# Altium integrated library Weidmueller_OMNIMATE_Signal.IntLib: 2550 symbols (part 36 of 45)
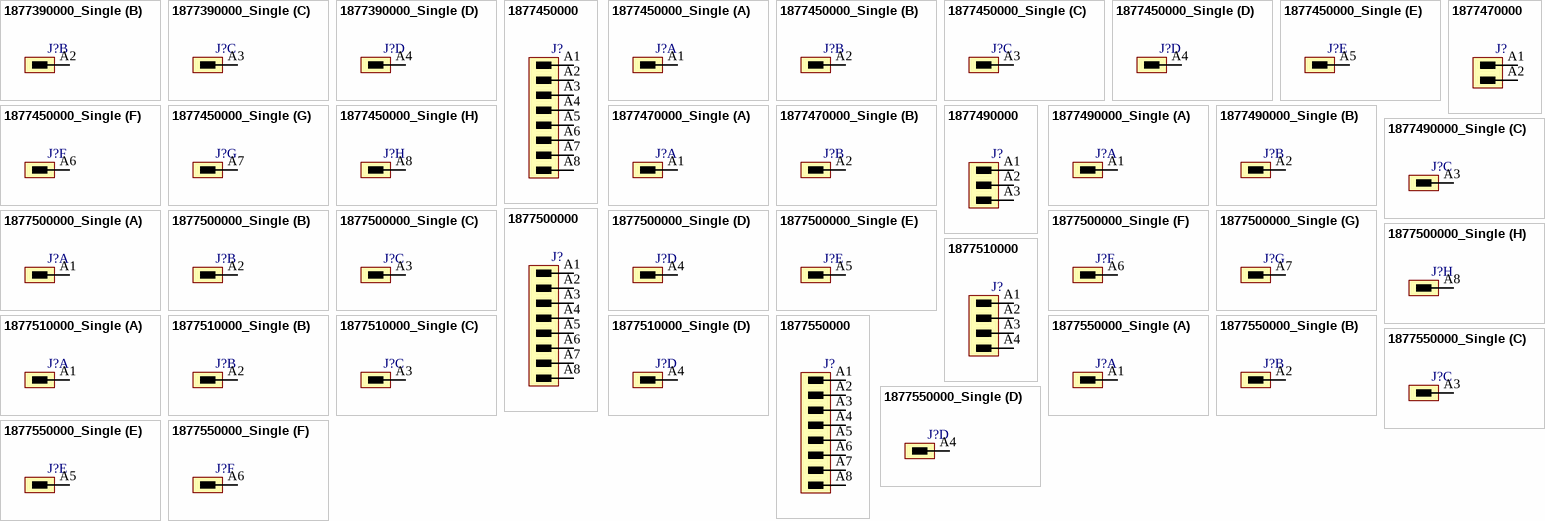
[diagram p246: symbols 1877390000_Single to 1877550000_Single]

## 1877510000_Single
designator J?
OMNIMATE Signal - series BL/SL 5.08; PartNumber: 1877510000; Manufacturer: Weidmueller; Short_text_for_material: SL-SMT 5.08/04/270GL 3.2SN BK BX; Side_termination_characteristic: closed side; Mounting_onto_the_PCB: Reflow solder connection; Pitch_mm: 5.08 mm; Pitch_inch: 0.2 inch; No_of_poles: 4; Outgoing_elbow: 270°; Solder_pin_length_mm: 3.2 mm; Contact_material: CuSn; Contact_surface: tinned; Insulating_material: LCP GF; UL_94_flammability_rating: V-0; Rated_voltage_for_surge_voltage_class_pollution_degree_II_2: 400 V; Rated_current_min_no_of_poles_TU_20_deg_C: 19 A; Rated_voltage_use_group_B_UL_1059: 300 V; Rated_current_use_group_B_UL_1059: 15 A; PackageReference: SL_SMT_5_08_270GL_04; Colour: Black; Packaging: Box; Qty: 100 PCS; Revision: V1; ComponentLink1Description: Manufacturer URL; ComponentLink1URL: http://www.weidmueller.com/; ComponentLink2Description: URL Link1; ComponentLink2URL: http://catalog.weidmueller.com/catalog/Start.do?localeId=en&ObjectID=1877510000
footprint SL_SMT_5_08_270GL_04 (OMNIMATE Signal - Serie BL/SL 5.08  SL-SMT 5.08/04/270GL 3.2)
part A pins: A1
part B pins: A2
part C pins: A3
part D pins: A4

## 1877550000
designator J?
OMNIMATE Signal - series BL/SL 5.08; PartNumber: 1877550000; Manufacturer: Weidmueller; Short_text_for_material: SL-SMT 5.08/08/270GL 3.2SN BK BX; Side_termination_characteristic: closed side; Mounting_onto_the_PCB: Reflow solder connection; Pitch_mm: 5.08 mm; Pitch_inch: 0.2 inch; No_of_poles: 8; Outgoing_elbow: 270°; Solder_pin_length_mm: 3.2 mm; Contact_material: CuSn; Contact_surface: tinned; Insulating_material: LCP GF; UL_94_flammability_rating: V-0; Rated_voltage_for_surge_voltage_class_pollution_degree_II_2: 400 V; Rated_current_min_no_of_poles_TU_20_deg_C: 19 A; Rated_voltage_use_group_B_UL_1059: 300 V; Rated_current_use_group_B_UL_1059: 15 A; PackageReference: SL_SMT_5_08_270GL_08; Colour: Black; Packaging: Box; Qty: 50 PCS; Revision: V1; ComponentLink1Description: Manufacturer URL; ComponentLink1URL: http://www.weidmueller.com/; ComponentLink2Description: URL Link1; ComponentLink2URL: http://catalog.weidmueller.com/catalog/Start.do?localeId=en&ObjectID=1877550000
footprint SL_SMT_5_08_270GL_08 (OMNIMATE Signal - Serie BL/SL 5.08  SL-SMT 5.08/08/270GL 3.2)
pins: A1, A2, A3, A4, A5, A6, A7, A8

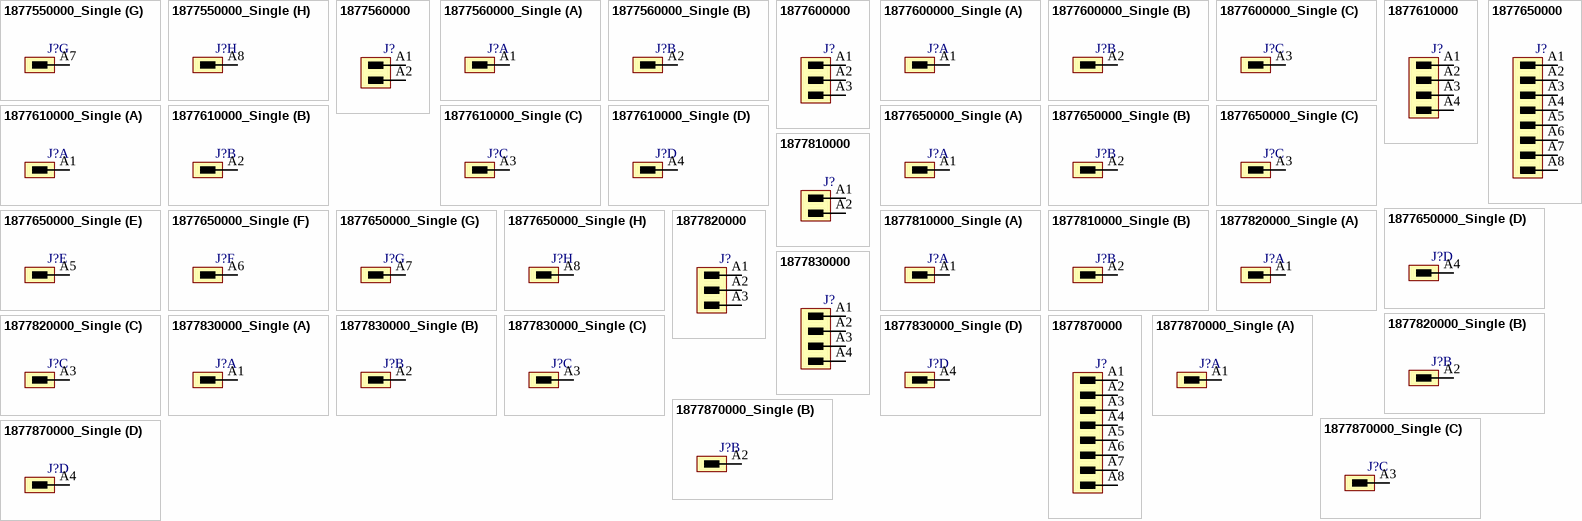
[diagram p169: symbols 1877550000_Single to 1877870000_Single]

## 1877550000_Single
designator J?
OMNIMATE Signal - series BL/SL 5.08; PartNumber: 1877550000; Manufacturer: Weidmueller; Short_text_for_material: SL-SMT 5.08/08/270GL 3.2SN BK BX; Side_termination_characteristic: closed side; Mounting_onto_the_PCB: Reflow solder connection; Pitch_mm: 5.08 mm; Pitch_inch: 0.2 inch; No_of_poles: 8; Outgoing_elbow: 270°; Solder_pin_length_mm: 3.2 mm; Contact_material: CuSn; Contact_surface: tinned; Insulating_material: LCP GF; UL_94_flammability_rating: V-0; Rated_voltage_for_surge_voltage_class_pollution_degree_II_2: 400 V; Rated_current_min_no_of_poles_TU_20_deg_C: 19 A; Rated_voltage_use_group_B_UL_1059: 300 V; Rated_current_use_group_B_UL_1059: 15 A; PackageReference: SL_SMT_5_08_270GL_08; Colour: Black; Packaging: Box; Qty: 50 PCS; Revision: V1; ComponentLink1Description: Manufacturer URL; ComponentLink1URL: http://www.weidmueller.com/; ComponentLink2Description: URL Link1; ComponentLink2URL: http://catalog.weidmueller.com/catalog/Start.do?localeId=en&ObjectID=1877550000
footprint SL_SMT_5_08_270GL_08 (OMNIMATE Signal - Serie BL/SL 5.08  SL-SMT 5.08/08/270GL 3.2)
part A pins: A1
part B pins: A2
part C pins: A3
part D pins: A4
part E pins: A5
part F pins: A6
part G pins: A7
part H pins: A8

## 1877560000
designator J?
OMNIMATE Signal - series BL/SL 5.08; PartNumber: 1877560000; Manufacturer: Weidmueller; Short_text_for_material: SL-SMT 5.08/02/270GH 1.5SN BK RL; Side_termination_characteristic: closed side; Mounting_onto_the_PCB: Reflow solder connection; Pitch_mm: 5.08 mm; Pitch_inch: 0.2 inch; No_of_poles: 2; Outgoing_elbow: 270°; Solder_pin_length_mm: 1.5 mm; Contact_surface: tinned; Insulating_material: LCP GF; UL_94_flammability_rating: V-0; Rated_voltage_for_surge_voltage_class_pollution_degree_II_2: 400 V; Rated_current_min_no_of_poles_TU_20_deg_C: 19 A; Rated_voltage_use_group_B_UL_1059: 300 V; Rated_current_use_group_B_UL_1059: 15 A; PackageReference: SL_SMT_5_08_270GH_02; Colour: Black; Packaging: Tape; Qty: 335 PCS; Revision: V1; ComponentLink1Description: Manufacturer URL; ComponentLink1URL: http://www.weidmueller.com/; ComponentLink2Description: URL Link1; ComponentLink2URL: http://catalog.weidmueller.com/catalog/Start.do?localeId=en&ObjectID=1877560000
footprint SL_SMT_5_08_270GH_02 (OMNIMATE Signal - Serie BL/SL 5.08  SL-SMT 5.08/02/270GH 3.2)
pins: A1, A2

## 1877560000_Single
designator J?
OMNIMATE Signal - series BL/SL 5.08; PartNumber: 1877560000; Manufacturer: Weidmueller; Short_text_for_material: SL-SMT 5.08/02/270GH 1.5SN BK RL; Side_termination_characteristic: closed side; Mounting_onto_the_PCB: Reflow solder connection; Pitch_mm: 5.08 mm; Pitch_inch: 0.2 inch; No_of_poles: 2; Outgoing_elbow: 270°; Solder_pin_length_mm: 1.5 mm; Contact_surface: tinned; Insulating_material: LCP GF; UL_94_flammability_rating: V-0; Rated_voltage_for_surge_voltage_class_pollution_degree_II_2: 400 V; Rated_current_min_no_of_poles_TU_20_deg_C: 19 A; Rated_voltage_use_group_B_UL_1059: 300 V; Rated_current_use_group_B_UL_1059: 15 A; PackageReference: SL_SMT_5_08_270GH_02; Colour: Black; Packaging: Tape; Qty: 335 PCS; Revision: V1; ComponentLink1Description: Manufacturer URL; ComponentLink1URL: http://www.weidmueller.com/; ComponentLink2Description: URL Link1; ComponentLink2URL: http://catalog.weidmueller.com/catalog/Start.do?localeId=en&ObjectID=1877560000
footprint SL_SMT_5_08_270GH_02 (OMNIMATE Signal - Serie BL/SL 5.08  SL-SMT 5.08/02/270GH 3.2)
part A pins: A1
part B pins: A2

## 1877600000
designator J?
OMNIMATE Signal - series BL/SL 5.08; PartNumber: 1877600000; Manufacturer: Weidmueller; Short_text_for_material: SL-SMT 5.08/03/270GH 1.5SN BK RL; Side_termination_characteristic: closed side; Mounting_onto_the_PCB: Reflow solder connection; Pitch_mm: 5.08 mm; Pitch_inch: 0.2 inch; No_of_poles: 3; Outgoing_elbow: 270°; Solder_pin_length_mm: 1.5 mm; Contact_surface: tinned; Insulating_material: LCP GF; UL_94_flammability_rating: V-0; Rated_voltage_for_surge_voltage_class_pollution_degree_II_2: 400 V; Rated_current_min_no_of_poles_TU_20_deg_C: 19 A; Rated_voltage_use_group_B_UL_1059: 300 V; Rated_current_use_group_B_UL_1059: 15 A; PackageReference: SL_SMT_5_08_270GH_03; Colour: Black; Packaging: Tape; Qty: 335 PCS; Revision: V1; ComponentLink1Description: Manufacturer URL; ComponentLink1URL: http://www.weidmueller.com/; ComponentLink2Description: URL Link1; ComponentLink2URL: http://catalog.weidmueller.com/catalog/Start.do?localeId=en&ObjectID=1877600000
footprint SL_SMT_5_08_270GH_03 (OMNIMATE Signal - Serie BL/SL 5.08  SL-SMT 5.08/03/270GH 3.2)
pins: A1, A2, A3

## 1877600000_Single
designator J?
OMNIMATE Signal - series BL/SL 5.08; PartNumber: 1877600000; Manufacturer: Weidmueller; Short_text_for_material: SL-SMT 5.08/03/270GH 1.5SN BK RL; Side_termination_characteristic: closed side; Mounting_onto_the_PCB: Reflow solder connection; Pitch_mm: 5.08 mm; Pitch_inch: 0.2 inch; No_of_poles: 3; Outgoing_elbow: 270°; Solder_pin_length_mm: 1.5 mm; Contact_surface: tinned; Insulating_material: LCP GF; UL_94_flammability_rating: V-0; Rated_voltage_for_surge_voltage_class_pollution_degree_II_2: 400 V; Rated_current_min_no_of_poles_TU_20_deg_C: 19 A; Rated_voltage_use_group_B_UL_1059: 300 V; Rated_current_use_group_B_UL_1059: 15 A; PackageReference: SL_SMT_5_08_270GH_03; Colour: Black; Packaging: Tape; Qty: 335 PCS; Revision: V1; ComponentLink1Description: Manufacturer URL; ComponentLink1URL: http://www.weidmueller.com/; ComponentLink2Description: URL Link1; ComponentLink2URL: http://catalog.weidmueller.com/catalog/Start.do?localeId=en&ObjectID=1877600000
footprint SL_SMT_5_08_270GH_03 (OMNIMATE Signal - Serie BL/SL 5.08  SL-SMT 5.08/03/270GH 3.2)
part A pins: A1
part B pins: A2
part C pins: A3

## 1877610000
designator J?
OMNIMATE Signal - series BL/SL 5.08; PartNumber: 1877610000; Manufacturer: Weidmueller; Short_text_for_material: SL-SMT 5.08/04/270GH 1.5SN BK RL; Side_termination_characteristic: closed side; Mounting_onto_the_PCB: Reflow solder connection; Pitch_mm: 5.08 mm; Pitch_inch: 0.2 inch; No_of_poles: 4; Outgoing_elbow: 270°; Solder_pin_length_mm: 1.5 mm; Contact_surface: tinned; Insulating_material: LCP GF; UL_94_flammability_rating: V-0; Rated_voltage_for_surge_voltage_class_pollution_degree_II_2: 400 V; Rated_current_min_no_of_poles_TU_20_deg_C: 19 A; Rated_voltage_use_group_B_UL_1059: 300 V; Rated_current_use_group_B_UL_1059: 15 A; PackageReference: SL_SMT_5_08_270GH_04; Colour: Black; Packaging: Tape; Qty: 335 PCS; Revision: V1; ComponentLink1Description: Manufacturer URL; ComponentLink1URL: http://www.weidmueller.com/; ComponentLink2Description: URL Link1; ComponentLink2URL: http://catalog.weidmueller.com/catalog/Start.do?localeId=en&ObjectID=1877610000
footprint SL_SMT_5_08_270GH_04 (OMNIMATE Signal - Serie BL/SL 5.08  SL-SMT 5.08/04/270GH 3.2)
pins: A1, A2, A3, A4

## 1877610000_Single
designator J?
OMNIMATE Signal - series BL/SL 5.08; PartNumber: 1877610000; Manufacturer: Weidmueller; Short_text_for_material: SL-SMT 5.08/04/270GH 1.5SN BK RL; Side_termination_characteristic: closed side; Mounting_onto_the_PCB: Reflow solder connection; Pitch_mm: 5.08 mm; Pitch_inch: 0.2 inch; No_of_poles: 4; Outgoing_elbow: 270°; Solder_pin_length_mm: 1.5 mm; Contact_surface: tinned; Insulating_material: LCP GF; UL_94_flammability_rating: V-0; Rated_voltage_for_surge_voltage_class_pollution_degree_II_2: 400 V; Rated_current_min_no_of_poles_TU_20_deg_C: 19 A; Rated_voltage_use_group_B_UL_1059: 300 V; Rated_current_use_group_B_UL_1059: 15 A; PackageReference: SL_SMT_5_08_270GH_04; Colour: Black; Packaging: Tape; Qty: 335 PCS; Revision: V1; ComponentLink1Description: Manufacturer URL; ComponentLink1URL: http://www.weidmueller.com/; ComponentLink2Description: URL Link1; ComponentLink2URL: http://catalog.weidmueller.com/catalog/Start.do?localeId=en&ObjectID=1877610000
footprint SL_SMT_5_08_270GH_04 (OMNIMATE Signal - Serie BL/SL 5.08  SL-SMT 5.08/04/270GH 3.2)
part A pins: A1
part B pins: A2
part C pins: A3
part D pins: A4

## 1877650000
designator J?
OMNIMATE Signal - series BL/SL 5.08; PartNumber: 1877650000; Manufacturer: Weidmueller; Short_text_for_material: SL-SMT 5.08/08/270GH 1.5SN BK RL; Side_termination_characteristic: closed side; Mounting_onto_the_PCB: Reflow solder connection; Pitch_mm: 5.08 mm; Pitch_inch: 0.2 inch; No_of_poles: 8; Outgoing_elbow: 270°; Solder_pin_length_mm: 1.5 mm; Contact_surface: tinned; Insulating_material: LCP GF; UL_94_flammability_rating: V-0; Rated_voltage_for_surge_voltage_class_pollution_degree_II_2: 400 V; Rated_current_min_no_of_poles_TU_20_deg_C: 19 A; Rated_voltage_use_group_B_UL_1059: 300 V; Rated_current_use_group_B_UL_1059: 15 A; PackageReference: SL_SMT_5_08_270GH_08; Colour: Black; Packaging: Tape; Qty: 285 PCS; Revision: V1; ComponentLink1Description: Manufacturer URL; ComponentLink1URL: http://www.weidmueller.com/; ComponentLink2Description: URL Link1; ComponentLink2URL: http://catalog.weidmueller.com/catalog/Start.do?localeId=en&ObjectID=1877650000
footprint SL_SMT_5_08_270GH_08 (OMNIMATE Signal - Serie BL/SL 5.08  SL-SMT 5.08/08/270GH 3.2)
pins: A1, A2, A3, A4, A5, A6, A7, A8

## 1877650000_Single
designator J?
OMNIMATE Signal - series BL/SL 5.08; PartNumber: 1877650000; Manufacturer: Weidmueller; Short_text_for_material: SL-SMT 5.08/08/270GH 1.5SN BK RL; Side_termination_characteristic: closed side; Mounting_onto_the_PCB: Reflow solder connection; Pitch_mm: 5.08 mm; Pitch_inch: 0.2 inch; No_of_poles: 8; Outgoing_elbow: 270°; Solder_pin_length_mm: 1.5 mm; Contact_surface: tinned; Insulating_material: LCP GF; UL_94_flammability_rating: V-0; Rated_voltage_for_surge_voltage_class_pollution_degree_II_2: 400 V; Rated_current_min_no_of_poles_TU_20_deg_C: 19 A; Rated_voltage_use_group_B_UL_1059: 300 V; Rated_current_use_group_B_UL_1059: 15 A; PackageReference: SL_SMT_5_08_270GH_08; Colour: Black; Packaging: Tape; Qty: 285 PCS; Revision: V1; ComponentLink1Description: Manufacturer URL; ComponentLink1URL: http://www.weidmueller.com/; ComponentLink2Description: URL Link1; ComponentLink2URL: http://catalog.weidmueller.com/catalog/Start.do?localeId=en&ObjectID=1877650000
footprint SL_SMT_5_08_270GH_08 (OMNIMATE Signal - Serie BL/SL 5.08  SL-SMT 5.08/08/270GH 3.2)
part A pins: A1
part B pins: A2
part C pins: A3
part D pins: A4
part E pins: A5
part F pins: A6
part G pins: A7
part H pins: A8

## 1877810000
designator J?
OMNIMATE Signal - series BL/SL 5.08; PartNumber: 1877810000; Manufacturer: Weidmueller; Short_text_for_material: SL-SMT 5.08/02/270GH 3.2SN BK RL; Side_termination_characteristic: closed side; Mounting_onto_the_PCB: Reflow solder connection; Pitch_mm: 5.08 mm; Pitch_inch: 0.2 inch; No_of_poles: 2; Outgoing_elbow: 270°; Solder_pin_length_mm: 3.2 mm; Contact_surface: tinned; Insulating_material: LCP GF; UL_94_flammability_rating: V-0; Rated_voltage_for_surge_voltage_class_pollution_degree_II_2: 400 V; Rated_current_min_no_of_poles_TU_20_deg_C: 19 A; Rated_voltage_use_group_B_UL_1059: 300 V; Rated_current_use_group_B_UL_1059: 15 A; PackageReference: SL_SMT_5_08_270GH_02; Colour: Black; Packaging: Tape; Qty: 335 PCS; Revision: V1; ComponentLink1Description: Manufacturer URL; ComponentLink1URL: http://www.weidmueller.com/; ComponentLink2Description: URL Link1; ComponentLink2URL: http://catalog.weidmueller.com/catalog/Start.do?localeId=en&ObjectID=1877810000
footprint SL_SMT_5_08_270GH_02 (OMNIMATE Signal - Serie BL/SL 5.08  SL-SMT 5.08/02/270GH 3.2)
pins: A1, A2

## 1877810000_Single
designator J?
OMNIMATE Signal - series BL/SL 5.08; PartNumber: 1877810000; Manufacturer: Weidmueller; Short_text_for_material: SL-SMT 5.08/02/270GH 3.2SN BK RL; Side_termination_characteristic: closed side; Mounting_onto_the_PCB: Reflow solder connection; Pitch_mm: 5.08 mm; Pitch_inch: 0.2 inch; No_of_poles: 2; Outgoing_elbow: 270°; Solder_pin_length_mm: 3.2 mm; Contact_surface: tinned; Insulating_material: LCP GF; UL_94_flammability_rating: V-0; Rated_voltage_for_surge_voltage_class_pollution_degree_II_2: 400 V; Rated_current_min_no_of_poles_TU_20_deg_C: 19 A; Rated_voltage_use_group_B_UL_1059: 300 V; Rated_current_use_group_B_UL_1059: 15 A; PackageReference: SL_SMT_5_08_270GH_02; Colour: Black; Packaging: Tape; Qty: 335 PCS; Revision: V1; ComponentLink1Description: Manufacturer URL; ComponentLink1URL: http://www.weidmueller.com/; ComponentLink2Description: URL Link1; ComponentLink2URL: http://catalog.weidmueller.com/catalog/Start.do?localeId=en&ObjectID=1877810000
footprint SL_SMT_5_08_270GH_02 (OMNIMATE Signal - Serie BL/SL 5.08  SL-SMT 5.08/02/270GH 3.2)
part A pins: A1
part B pins: A2

## 1877820000
designator J?
OMNIMATE Signal - series BL/SL 5.08; PartNumber: 1877820000; Manufacturer: Weidmueller; Short_text_for_material: SL-SMT 5.08/03/270GH 3.2SN BK RL; Side_termination_characteristic: closed side; Mounting_onto_the_PCB: Reflow solder connection; Pitch_mm: 5.08 mm; Pitch_inch: 0.2 inch; No_of_poles: 3; Outgoing_elbow: 270°; Solder_pin_length_mm: 3.2 mm; Contact_surface: tinned; Insulating_material: LCP GF; UL_94_flammability_rating: V-0; Rated_voltage_for_surge_voltage_class_pollution_degree_II_2: 400 V; Rated_current_min_no_of_poles_TU_20_deg_C: 19 A; Rated_voltage_use_group_B_UL_1059: 300 V; Rated_current_use_group_B_UL_1059: 15 A; PackageReference: SL_SMT_5_08_270GH_03; Colour: Black; Packaging: Tape; Qty: 335 PCS; Revision: V1; ComponentLink1Description: Manufacturer URL; ComponentLink1URL: http://www.weidmueller.com/; ComponentLink2Description: URL Link1; ComponentLink2URL: http://catalog.weidmueller.com/catalog/Start.do?localeId=en&ObjectID=1877820000
footprint SL_SMT_5_08_270GH_03 (OMNIMATE Signal - Serie BL/SL 5.08  SL-SMT 5.08/03/270GH 3.2)
pins: A1, A2, A3

## 1877820000_Single
designator J?
OMNIMATE Signal - series BL/SL 5.08; PartNumber: 1877820000; Manufacturer: Weidmueller; Short_text_for_material: SL-SMT 5.08/03/270GH 3.2SN BK RL; Side_termination_characteristic: closed side; Mounting_onto_the_PCB: Reflow solder connection; Pitch_mm: 5.08 mm; Pitch_inch: 0.2 inch; No_of_poles: 3; Outgoing_elbow: 270°; Solder_pin_length_mm: 3.2 mm; Contact_surface: tinned; Insulating_material: LCP GF; UL_94_flammability_rating: V-0; Rated_voltage_for_surge_voltage_class_pollution_degree_II_2: 400 V; Rated_current_min_no_of_poles_TU_20_deg_C: 19 A; Rated_voltage_use_group_B_UL_1059: 300 V; Rated_current_use_group_B_UL_1059: 15 A; PackageReference: SL_SMT_5_08_270GH_03; Colour: Black; Packaging: Tape; Qty: 335 PCS; Revision: V1; ComponentLink1Description: Manufacturer URL; ComponentLink1URL: http://www.weidmueller.com/; ComponentLink2Description: URL Link1; ComponentLink2URL: http://catalog.weidmueller.com/catalog/Start.do?localeId=en&ObjectID=1877820000
footprint SL_SMT_5_08_270GH_03 (OMNIMATE Signal - Serie BL/SL 5.08  SL-SMT 5.08/03/270GH 3.2)
part A pins: A1
part B pins: A2
part C pins: A3

## 1877830000
designator J?
OMNIMATE Signal - series BL/SL 5.08; PartNumber: 1877830000; Manufacturer: Weidmueller; Short_text_for_material: SL-SMT 5.08/04/270GH 3.2SN BK RL; Side_termination_characteristic: closed side; Mounting_onto_the_PCB: Reflow solder connection; Pitch_mm: 5.08 mm; Pitch_inch: 0.2 inch; No_of_poles: 4; Outgoing_elbow: 270°; Solder_pin_length_mm: 3.2 mm; Contact_surface: tinned; Insulating_material: LCP GF; UL_94_flammability_rating: V-0; Rated_voltage_for_surge_voltage_class_pollution_degree_II_2: 400 V; Rated_current_min_no_of_poles_TU_20_deg_C: 19 A; Rated_voltage_use_group_B_UL_1059: 300 V; Rated_current_use_group_B_UL_1059: 15 A; PackageReference: SL_SMT_5_08_270GH_04; Colour: Black; Packaging: Tape; Qty: 225 PCS; Revision: V1; ComponentLink1Description: Manufacturer URL; ComponentLink1URL: http://www.weidmueller.com/; ComponentLink2Description: URL Link1; ComponentLink2URL: http://catalog.weidmueller.com/catalog/Start.do?localeId=en&ObjectID=1877830000
footprint SL_SMT_5_08_270GH_04 (OMNIMATE Signal - Serie BL/SL 5.08  SL-SMT 5.08/04/270GH 3.2)
pins: A1, A2, A3, A4

## 1877830000_Single
designator J?
OMNIMATE Signal - series BL/SL 5.08; PartNumber: 1877830000; Manufacturer: Weidmueller; Short_text_for_material: SL-SMT 5.08/04/270GH 3.2SN BK RL; Side_termination_characteristic: closed side; Mounting_onto_the_PCB: Reflow solder connection; Pitch_mm: 5.08 mm; Pitch_inch: 0.2 inch; No_of_poles: 4; Outgoing_elbow: 270°; Solder_pin_length_mm: 3.2 mm; Contact_surface: tinned; Insulating_material: LCP GF; UL_94_flammability_rating: V-0; Rated_voltage_for_surge_voltage_class_pollution_degree_II_2: 400 V; Rated_current_min_no_of_poles_TU_20_deg_C: 19 A; Rated_voltage_use_group_B_UL_1059: 300 V; Rated_current_use_group_B_UL_1059: 15 A; PackageReference: SL_SMT_5_08_270GH_04; Colour: Black; Packaging: Tape; Qty: 225 PCS; Revision: V1; ComponentLink1Description: Manufacturer URL; ComponentLink1URL: http://www.weidmueller.com/; ComponentLink2Description: URL Link1; ComponentLink2URL: http://catalog.weidmueller.com/catalog/Start.do?localeId=en&ObjectID=1877830000
footprint SL_SMT_5_08_270GH_04 (OMNIMATE Signal - Serie BL/SL 5.08  SL-SMT 5.08/04/270GH 3.2)
part A pins: A1
part B pins: A2
part C pins: A3
part D pins: A4

## 1877870000
designator J?
OMNIMATE Signal - series BL/SL 5.08; PartNumber: 1877870000; Manufacturer: Weidmueller; Short_text_for_material: SL-SMT 5.08/08/270GH 3.2SN BK RL; Side_termination_characteristic: closed side; Mounting_onto_the_PCB: Reflow solder connection; Pitch_mm: 5.08 mm; Pitch_inch: 0.2 inch; No_of_poles: 8; Outgoing_elbow: 270°; Solder_pin_length_mm: 3.2 mm; Contact_surface: tinned; Insulating_material: LCP GF; UL_94_flammability_rating: V-0; Rated_voltage_for_surge_voltage_class_pollution_degree_II_2: 400 V; Rated_current_min_no_of_poles_TU_20_deg_C: 19 A; Rated_voltage_use_group_B_UL_1059: 300 V; Rated_current_use_group_B_UL_1059: 15 A; PackageReference: SL_SMT_5_08_270GH_08; Colour: Black; Packaging: Tape; Qty: 285 PCS; Revision: V1; ComponentLink1Description: Manufacturer URL; ComponentLink1URL: http://www.weidmueller.com/; ComponentLink2Description: URL Link1; ComponentLink2URL: http://catalog.weidmueller.com/catalog/Start.do?localeId=en&ObjectID=1877870000
footprint SL_SMT_5_08_270GH_08 (OMNIMATE Signal - Serie BL/SL 5.08  SL-SMT 5.08/08/270GH 3.2)
pins: A1, A2, A3, A4, A5, A6, A7, A8

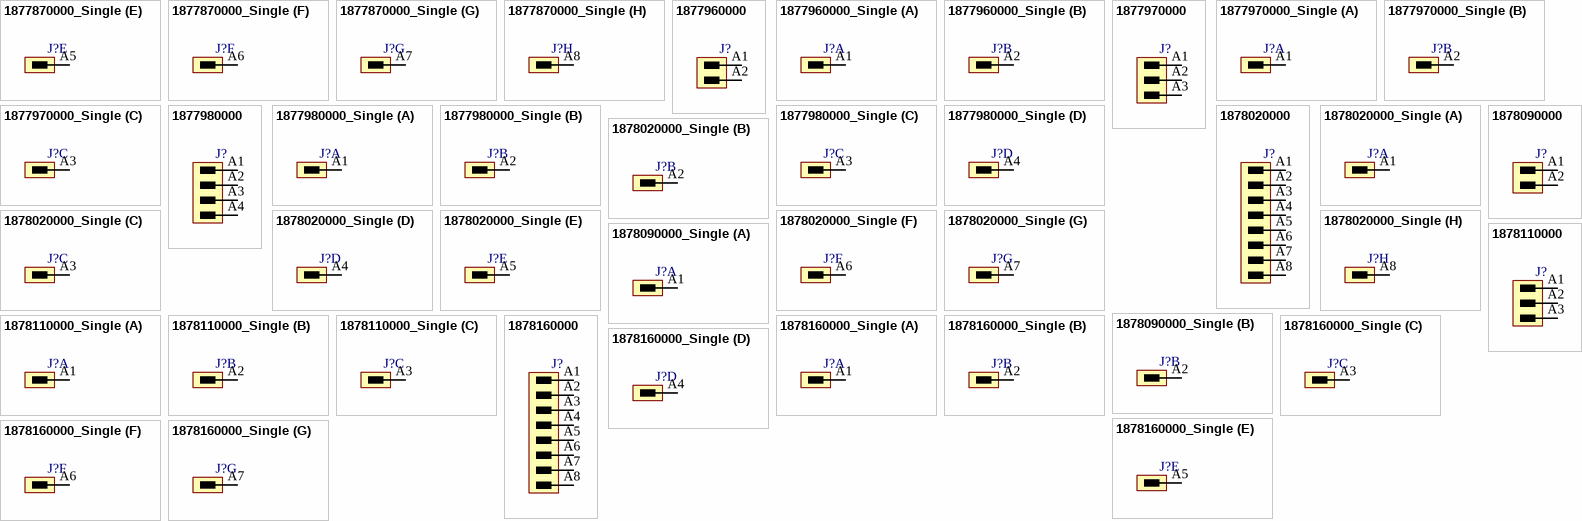
[diagram p170: symbols 1877870000_Single to 1878160000_Single]

## 1877870000_Single
designator J?
OMNIMATE Signal - series BL/SL 5.08; PartNumber: 1877870000; Manufacturer: Weidmueller; Short_text_for_material: SL-SMT 5.08/08/270GH 3.2SN BK RL; Side_termination_characteristic: closed side; Mounting_onto_the_PCB: Reflow solder connection; Pitch_mm: 5.08 mm; Pitch_inch: 0.2 inch; No_of_poles: 8; Outgoing_elbow: 270°; Solder_pin_length_mm: 3.2 mm; Contact_surface: tinned; Insulating_material: LCP GF; UL_94_flammability_rating: V-0; Rated_voltage_for_surge_voltage_class_pollution_degree_II_2: 400 V; Rated_current_min_no_of_poles_TU_20_deg_C: 19 A; Rated_voltage_use_group_B_UL_1059: 300 V; Rated_current_use_group_B_UL_1059: 15 A; PackageReference: SL_SMT_5_08_270GH_08; Colour: Black; Packaging: Tape; Qty: 285 PCS; Revision: V1; ComponentLink1Description: Manufacturer URL; ComponentLink1URL: http://www.weidmueller.com/; ComponentLink2Description: URL Link1; ComponentLink2URL: http://catalog.weidmueller.com/catalog/Start.do?localeId=en&ObjectID=1877870000
footprint SL_SMT_5_08_270GH_08 (OMNIMATE Signal - Serie BL/SL 5.08  SL-SMT 5.08/08/270GH 3.2)
part A pins: A1
part B pins: A2
part C pins: A3
part D pins: A4
part E pins: A5
part F pins: A6
part G pins: A7
part H pins: A8

## 1877960000
designator J?
OMNIMATE Signal - series BL/SL 5.08; PartNumber: 1877960000; Manufacturer: Weidmueller; Short_text_for_material: SL-SMT 5.08/02/270FH 1.5SN BK BX; Side_termination_characteristic: Solder flange; Mounting_onto_the_PCB: Reflow solder connection; Pitch_mm: 5.08 mm; Pitch_inch: 0.2 inch; No_of_poles: 2; Outgoing_elbow: 270°; Solder_pin_length_mm: 1.5 mm; Contact_surface: tinned; Insulating_material: LCP GF; UL_94_flammability_rating: V-0; Rated_voltage_for_surge_voltage_class_pollution_degree_II_2: 400 V; Rated_current_min_no_of_poles_TU_20_deg_C: 19 A; Rated_voltage_use_group_B_UL_1059: 300 V; Rated_current_use_group_B_UL_1059: 15 A; PackageReference: SL_SMT_5_08_270FH_02; Colour: Black; Packaging: Box; Qty: 100 PCS; Revision: V1; ComponentLink1Description: Manufacturer URL; ComponentLink1URL: http://www.weidmueller.com/; ComponentLink2Description: URL Link1; ComponentLink2URL: http://catalog.weidmueller.com/catalog/Start.do?localeId=en&ObjectID=1877960000
footprint SL_SMT_5_08_270FH_02 (OMNIMATE Signal - Serie BL/SL 5.08  SL-SMT 5.08/02/270)
pins: A1, A2

## 1877960000_Single
designator J?
OMNIMATE Signal - series BL/SL 5.08; PartNumber: 1877960000; Manufacturer: Weidmueller; Short_text_for_material: SL-SMT 5.08/02/270FH 1.5SN BK BX; Side_termination_characteristic: Solder flange; Mounting_onto_the_PCB: Reflow solder connection; Pitch_mm: 5.08 mm; Pitch_inch: 0.2 inch; No_of_poles: 2; Outgoing_elbow: 270°; Solder_pin_length_mm: 1.5 mm; Contact_surface: tinned; Insulating_material: LCP GF; UL_94_flammability_rating: V-0; Rated_voltage_for_surge_voltage_class_pollution_degree_II_2: 400 V; Rated_current_min_no_of_poles_TU_20_deg_C: 19 A; Rated_voltage_use_group_B_UL_1059: 300 V; Rated_current_use_group_B_UL_1059: 15 A; PackageReference: SL_SMT_5_08_270FH_02; Colour: Black; Packaging: Box; Qty: 100 PCS; Revision: V1; ComponentLink1Description: Manufacturer URL; ComponentLink1URL: http://www.weidmueller.com/; ComponentLink2Description: URL Link1; ComponentLink2URL: http://catalog.weidmueller.com/catalog/Start.do?localeId=en&ObjectID=1877960000
footprint SL_SMT_5_08_270FH_02 (OMNIMATE Signal - Serie BL/SL 5.08  SL-SMT 5.08/02/270)
part A pins: A1
part B pins: A2

## 1877970000
designator J?
OMNIMATE Signal - series BL/SL 5.08; PartNumber: 1877970000; Manufacturer: Weidmueller; Short_text_for_material: SL-SMT 5.08/03/270FH 1.5SN BK BX; Side_termination_characteristic: Solder flange; Mounting_onto_the_PCB: Reflow solder connection; Pitch_mm: 5.08 mm; Pitch_inch: 0.2 inch; No_of_poles: 3; Outgoing_elbow: 270°; Solder_pin_length_mm: 1.5 mm; Contact_surface: tinned; Insulating_material: LCP GF; UL_94_flammability_rating: V-0; Rated_voltage_for_surge_voltage_class_pollution_degree_II_2: 400 V; Rated_current_min_no_of_poles_TU_20_deg_C: 19 A; Rated_voltage_use_group_B_UL_1059: 300 V; Rated_current_use_group_B_UL_1059: 15 A; PackageReference: SL_SMT_5_08_270FH_03; Colour: Black; Packaging: Box; Qty: 100 PCS; Revision: V1; ComponentLink1Description: Manufacturer URL; ComponentLink1URL: http://www.weidmueller.com/; ComponentLink2Description: URL Link1; ComponentLink2URL: http://catalog.weidmueller.com/catalog/Start.do?localeId=en&ObjectID=1877970000
footprint SL_SMT_5_08_270FH_03 (OMNIMATE Signal - Serie BL/SL 5.08  SL-SMT 5.08/03/270)
pins: A1, A2, A3

## 1877970000_Single
designator J?
OMNIMATE Signal - series BL/SL 5.08; PartNumber: 1877970000; Manufacturer: Weidmueller; Short_text_for_material: SL-SMT 5.08/03/270FH 1.5SN BK BX; Side_termination_characteristic: Solder flange; Mounting_onto_the_PCB: Reflow solder connection; Pitch_mm: 5.08 mm; Pitch_inch: 0.2 inch; No_of_poles: 3; Outgoing_elbow: 270°; Solder_pin_length_mm: 1.5 mm; Contact_surface: tinned; Insulating_material: LCP GF; UL_94_flammability_rating: V-0; Rated_voltage_for_surge_voltage_class_pollution_degree_II_2: 400 V; Rated_current_min_no_of_poles_TU_20_deg_C: 19 A; Rated_voltage_use_group_B_UL_1059: 300 V; Rated_current_use_group_B_UL_1059: 15 A; PackageReference: SL_SMT_5_08_270FH_03; Colour: Black; Packaging: Box; Qty: 100 PCS; Revision: V1; ComponentLink1Description: Manufacturer URL; ComponentLink1URL: http://www.weidmueller.com/; ComponentLink2Description: URL Link1; ComponentLink2URL: http://catalog.weidmueller.com/catalog/Start.do?localeId=en&ObjectID=1877970000
footprint SL_SMT_5_08_270FH_03 (OMNIMATE Signal - Serie BL/SL 5.08  SL-SMT 5.08/03/270)
part A pins: A1
part B pins: A2
part C pins: A3

## 1877980000
designator J?
OMNIMATE Signal - series BL/SL 5.08; PartNumber: 1877980000; Manufacturer: Weidmueller; Short_text_for_material: SL-SMT 5.08/04/270FH 1.5SN BK BX; Side_termination_characteristic: Solder flange; Mounting_onto_the_PCB: Reflow solder connection; Pitch_mm: 5.08 mm; Pitch_inch: 0.2 inch; No_of_poles: 4; Outgoing_elbow: 270°; Solder_pin_length_mm: 1.5 mm; Contact_surface: tinned; Insulating_material: LCP GF; UL_94_flammability_rating: V-0; Rated_voltage_for_surge_voltage_class_pollution_degree_II_2: 400 V; Rated_current_min_no_of_poles_TU_20_deg_C: 19 A; Rated_voltage_use_group_B_UL_1059: 300 V; Rated_current_use_group_B_UL_1059: 15 A; PackageReference: SL_SMT_5_08_270FH_04; Colour: Black; Packaging: Box; Qty: 100 PCS; Revision: V1; ComponentLink1Description: Manufacturer URL; ComponentLink1URL: http://www.weidmueller.com/; ComponentLink2Description: URL Link1; ComponentLink2URL: http://catalog.weidmueller.com/catalog/Start.do?localeId=en&ObjectID=1877980000
footprint SL_SMT_5_08_270FH_04 (OMNIMATE Signal - Serie BL/SL 5.08  SL-SMT 5.08/04/270)
pins: A1, A2, A3, A4

## 1877980000_Single
designator J?
OMNIMATE Signal - series BL/SL 5.08; PartNumber: 1877980000; Manufacturer: Weidmueller; Short_text_for_material: SL-SMT 5.08/04/270FH 1.5SN BK BX; Side_termination_characteristic: Solder flange; Mounting_onto_the_PCB: Reflow solder connection; Pitch_mm: 5.08 mm; Pitch_inch: 0.2 inch; No_of_poles: 4; Outgoing_elbow: 270°; Solder_pin_length_mm: 1.5 mm; Contact_surface: tinned; Insulating_material: LCP GF; UL_94_flammability_rating: V-0; Rated_voltage_for_surge_voltage_class_pollution_degree_II_2: 400 V; Rated_current_min_no_of_poles_TU_20_deg_C: 19 A; Rated_voltage_use_group_B_UL_1059: 300 V; Rated_current_use_group_B_UL_1059: 15 A; PackageReference: SL_SMT_5_08_270FH_04; Colour: Black; Packaging: Box; Qty: 100 PCS; Revision: V1; ComponentLink1Description: Manufacturer URL; ComponentLink1URL: http://www.weidmueller.com/; ComponentLink2Description: URL Link1; ComponentLink2URL: http://catalog.weidmueller.com/catalog/Start.do?localeId=en&ObjectID=1877980000
footprint SL_SMT_5_08_270FH_04 (OMNIMATE Signal - Serie BL/SL 5.08  SL-SMT 5.08/04/270)
part A pins: A1
part B pins: A2
part C pins: A3
part D pins: A4

## 1878020000
designator J?
OMNIMATE Signal - series BL/SL 5.08; PartNumber: 1878020000; Manufacturer: Weidmueller; Short_text_for_material: SL-SMT 5.08/08/270FH 1.5SN BK BX; Side_termination_characteristic: Solder flange; Mounting_onto_the_PCB: Reflow solder connection; Pitch_mm: 5.08 mm; Pitch_inch: 0.2 inch; No_of_poles: 8; Outgoing_elbow: 270°; Solder_pin_length_mm: 1.5 mm; Contact_surface: tinned; Insulating_material: LCP GF; UL_94_flammability_rating: V-0; Rated_voltage_for_surge_voltage_class_pollution_degree_II_2: 400 V; Rated_current_min_no_of_poles_TU_20_deg_C: 19 A; Rated_voltage_use_group_B_UL_1059: 300 V; Rated_current_use_group_B_UL_1059: 15 A; PackageReference: SL_SMT_5_08_270FH_08; Colour: Black; Packaging: Box; Qty: 50 PCS; Revision: V1; ComponentLink1Description: Manufacturer URL; ComponentLink1URL: http://www.weidmueller.com/; ComponentLink2Description: URL Link1; ComponentLink2URL: http://catalog.weidmueller.com/catalog/Start.do?localeId=en&ObjectID=1878020000
footprint SL_SMT_5_08_270FH_08 (OMNIMATE Signal - Serie BL/SL 5.08  SL-SMT 5.08/08/270)
pins: A1, A2, A3, A4, A5, A6, A7, A8

## 1878020000_Single
designator J?
OMNIMATE Signal - series BL/SL 5.08; PartNumber: 1878020000; Manufacturer: Weidmueller; Short_text_for_material: SL-SMT 5.08/08/270FH 1.5SN BK BX; Side_termination_characteristic: Solder flange; Mounting_onto_the_PCB: Reflow solder connection; Pitch_mm: 5.08 mm; Pitch_inch: 0.2 inch; No_of_poles: 8; Outgoing_elbow: 270°; Solder_pin_length_mm: 1.5 mm; Contact_surface: tinned; Insulating_material: LCP GF; UL_94_flammability_rating: V-0; Rated_voltage_for_surge_voltage_class_pollution_degree_II_2: 400 V; Rated_current_min_no_of_poles_TU_20_deg_C: 19 A; Rated_voltage_use_group_B_UL_1059: 300 V; Rated_current_use_group_B_UL_1059: 15 A; PackageReference: SL_SMT_5_08_270FH_08; Colour: Black; Packaging: Box; Qty: 50 PCS; Revision: V1; ComponentLink1Description: Manufacturer URL; ComponentLink1URL: http://www.weidmueller.com/; ComponentLink2Description: URL Link1; ComponentLink2URL: http://catalog.weidmueller.com/catalog/Start.do?localeId=en&ObjectID=1878020000
footprint SL_SMT_5_08_270FH_08 (OMNIMATE Signal - Serie BL/SL 5.08  SL-SMT 5.08/08/270)
part A pins: A1
part B pins: A2
part C pins: A3
part D pins: A4
part E pins: A5
part F pins: A6
part G pins: A7
part H pins: A8

## 1878090000
designator J?
OMNIMATE Signal - series BL/SL 5.08; PartNumber: 1878090000; Manufacturer: Weidmueller; Short_text_for_material: SL-SMT 5.08/02/270FL 1.5SN BK BX; Side_termination_characteristic: Solder flange; Mounting_onto_the_PCB: Reflow solder connection; Pitch_mm: 5.08 mm; Pitch_inch: 0.2 inch; No_of_poles: 2; Outgoing_elbow: 270°; Solder_pin_length_mm: 1.5 mm; Contact_material: CuSn; Contact_surface: tinned; Insulating_material: LCP GF; UL_94_flammability_rating: V-0; Rated_voltage_for_surge_voltage_class_pollution_degree_II_2: 400 V; Rated_current_min_no_of_poles_TU_20_deg_C: 19 A; Rated_voltage_use_group_B_UL_1059: 300 V; Rated_current_use_group_B_UL_1059: 15 A; PackageReference: SL_SMT_5_08_270FL_02; Colour: Black; Packaging: Box; Qty: 100 PCS; Revision: V1; ComponentLink1Description: Manufacturer URL; ComponentLink1URL: http://www.weidmueller.com/; ComponentLink2Description: URL Link1; ComponentLink2URL: http://catalog.weidmueller.com/catalog/Start.do?localeId=en&ObjectID=1878090000
footprint SL_SMT_5_08_270FL_02 (OMNIMATE Signal - Serie BL/SL 5.08  SL-SMT 5.08/02/270)
pins: A1, A2

## 1878090000_Single
designator J?
OMNIMATE Signal - series BL/SL 5.08; PartNumber: 1878090000; Manufacturer: Weidmueller; Short_text_for_material: SL-SMT 5.08/02/270FL 1.5SN BK BX; Side_termination_characteristic: Solder flange; Mounting_onto_the_PCB: Reflow solder connection; Pitch_mm: 5.08 mm; Pitch_inch: 0.2 inch; No_of_poles: 2; Outgoing_elbow: 270°; Solder_pin_length_mm: 1.5 mm; Contact_material: CuSn; Contact_surface: tinned; Insulating_material: LCP GF; UL_94_flammability_rating: V-0; Rated_voltage_for_surge_voltage_class_pollution_degree_II_2: 400 V; Rated_current_min_no_of_poles_TU_20_deg_C: 19 A; Rated_voltage_use_group_B_UL_1059: 300 V; Rated_current_use_group_B_UL_1059: 15 A; PackageReference: SL_SMT_5_08_270FL_02; Colour: Black; Packaging: Box; Qty: 100 PCS; Revision: V1; ComponentLink1Description: Manufacturer URL; ComponentLink1URL: http://www.weidmueller.com/; ComponentLink2Description: URL Link1; ComponentLink2URL: http://catalog.weidmueller.com/catalog/Start.do?localeId=en&ObjectID=1878090000
footprint SL_SMT_5_08_270FL_02 (OMNIMATE Signal - Serie BL/SL 5.08  SL-SMT 5.08/02/270)
part A pins: A1
part B pins: A2

## 1878110000
designator J?
OMNIMATE Signal - series BL/SL 5.08; PartNumber: 1878110000; Manufacturer: Weidmueller; Short_text_for_material: SL-SMT 5.08/03/270FL 1.5SN BK BX; Side_termination_characteristic: Solder flange; Mounting_onto_the_PCB: Reflow solder connection; Pitch_mm: 5.08 mm; Pitch_inch: 0.2 inch; No_of_poles: 3; Outgoing_elbow: 270°; Solder_pin_length_mm: 1.5 mm; Contact_surface: tinned; Insulating_material: LCP GF; UL_94_flammability_rating: V-0; Rated_voltage_for_surge_voltage_class_pollution_degree_II_2: 400 V; Rated_current_min_no_of_poles_TU_20_deg_C: 19 A; Rated_voltage_use_group_B_UL_1059: 300 V; Rated_current_use_group_B_UL_1059: 15 A; PackageReference: SL_SMT_5_08_270FL_03; Colour: Black; Packaging: Box; Qty: 100 PCS; Revision: V1; ComponentLink1Description: Manufacturer URL; ComponentLink1URL: http://www.weidmueller.com/; ComponentLink2Description: URL Link1; ComponentLink2URL: http://catalog.weidmueller.com/catalog/Start.do?localeId=en&ObjectID=1878110000
footprint SL_SMT_5_08_270FL_03 (OMNIMATE Signal - Serie BL/SL 5.08  SL-SMT 5.08/03/270)
pins: A1, A2, A3

## 1878110000_Single
designator J?